# Altium footprint library MB1404.PcbLib: 69 footprints (part 3 of 5)
Each footprint in its own frame and in the unit in brackets; x right, y up, seen from the top. Pads: shape width x height; smd on the part's side, far side on the other; paste and mask are expansions set on the pad; w line width, h text height; cw(c..) or ccw(c..) is an arc to the next point about the centre after c.
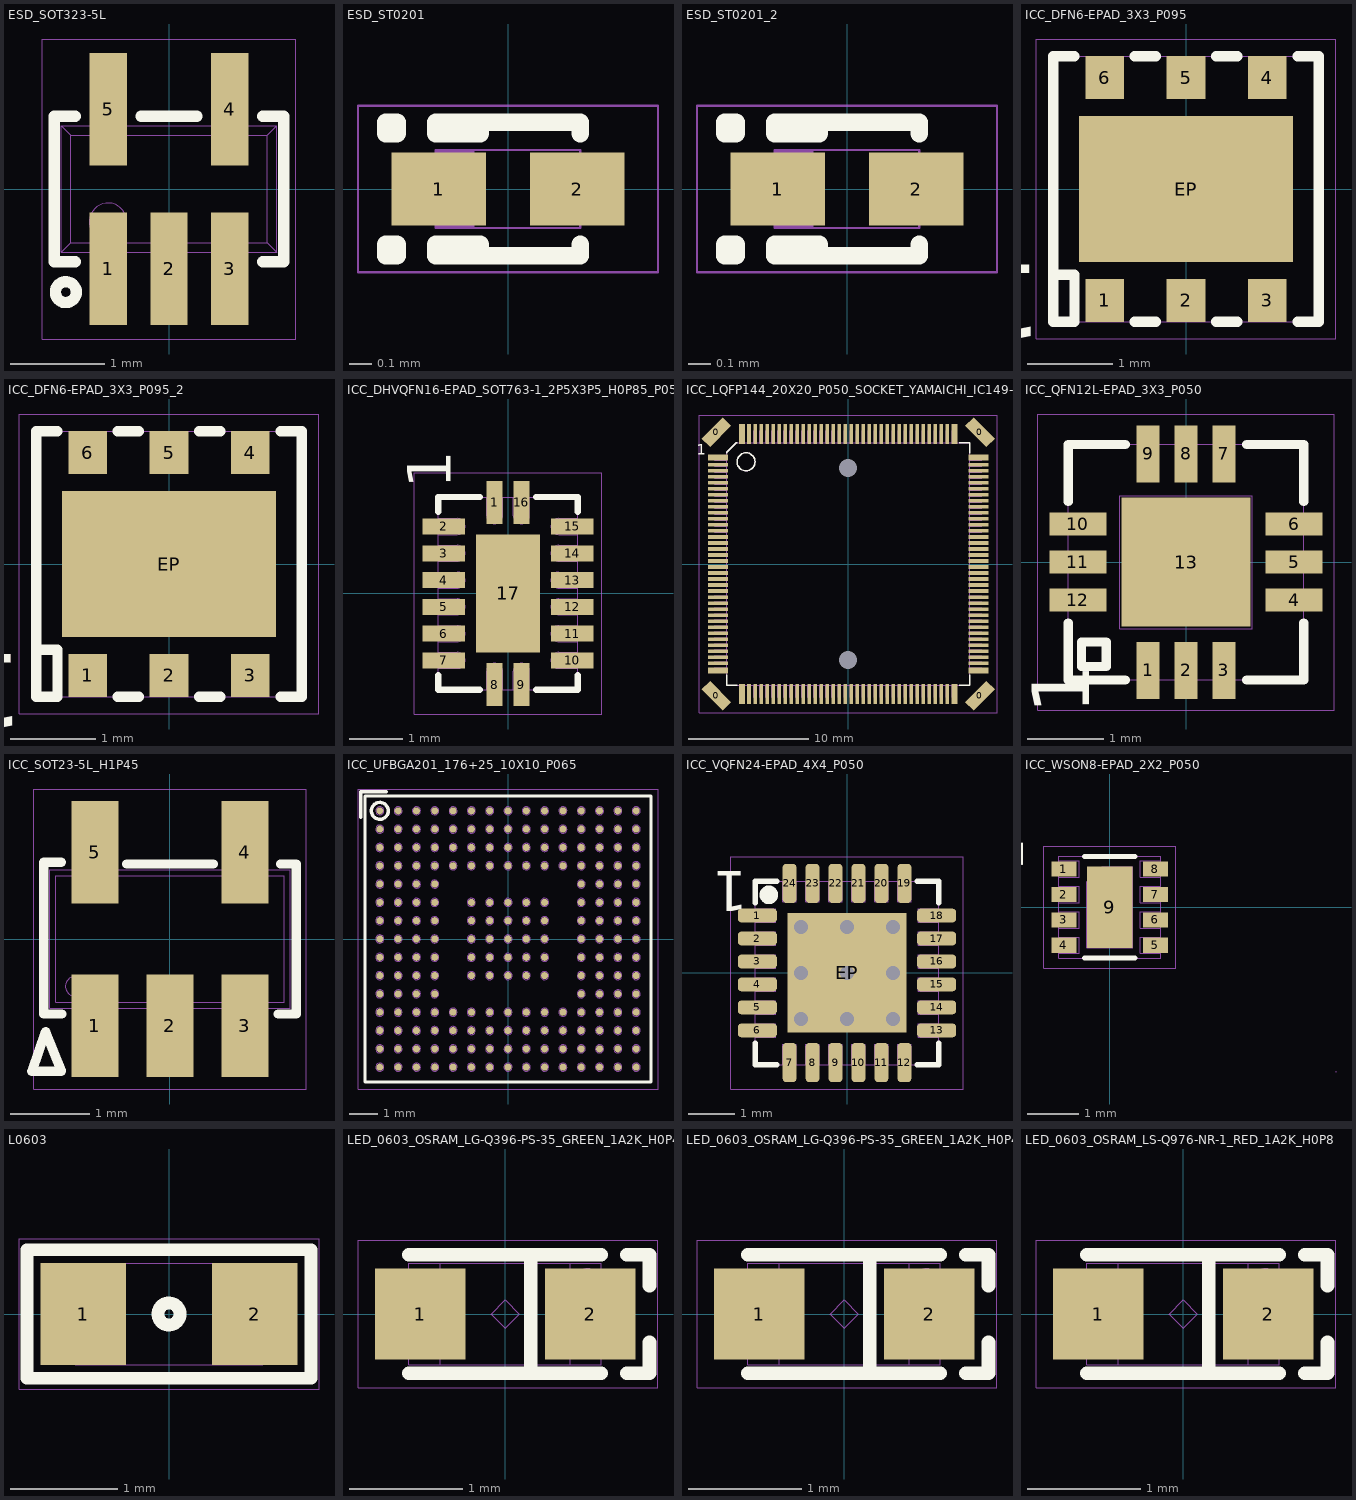
[diagram p2: the footprints below, top view; thin cyan lines are the x and y axes]

## ESD_SOT323-5L [mm]
height 1.1
pads (5):
  rect 0.4x1.2 smd mask+0.05: 1(-0.65,-0.85) 2(0,-0.85) 3(0.65,-0.85) 4(0.65,0.85) 5(-0.65,0.85)
Top Overlay:
  circle w0.12: c-1.1,-1.1 r0.112
  lines w0.12: -1,-0.775 -1.225,-0.775 -1.225,0.775 -1,0.775 ; -0.3,0.775 0.3,0.775 ; 1,-0.775 1.225,-0.775 1.225,0.775 1,0.775
Mechanical 14:
  circle w0.01: c-0.65,-0.35 r0.2
  lines w0.01: -0.75,-0.675 -0.75,-1.125 -0.55,-1.125 -0.55,-0.675 ; -0.75,0.675 -0.75,1.125 -0.55,1.125 -0.55,0.675 ; -0.1,-0.675 -0.1,-1.125 0.1,-1.125 0.1,-0.675 ; 0.55,-0.675 0.55,-1.125 0.75,-1.125 0.75,-0.675 ; 0.55,0.675 0.55,1.125 0.75,1.125 0.75,0.675 ; -1.15,-0.675 -1.05,-0.575 ; -1.15,-0.675 -1.15,0.675 ; -1.15,-0.675 1.15,-0.675 ; -1.15,0.675 -1.05,0.575 ; -1.15,0.675 1.15,0.675 ; -1.05,-0.575 -1.05,0.575 ; -1.05,-0.575 1.05,-0.575 ; -1.05,0.575 1.05,0.575 ; 1.05,-0.575 1.15,-0.675 ; 1.05,-0.575 1.05,0.575 ; 1.05,0.575 1.15,0.675 ; 1.15,-0.675 1.15,0.675
  text "'.Designator'" at -1.9,-0.55 h0.75
Mechanical 16:
  lines w0.01: -1.35,-1.6 1.35,-1.6 1.35,1.6 -1.35,1.6 -1.35,-1.6
3D body: height 1.1, standoff 0, extent -1.15,-0.675 1.15,0.675
3D body "SOT323-5L.STEP": height 1, standoff 0, extent -1.05,-1.051 1.05,1.051

## ESD_ST0201 [mm]
height 0.33
pads (2):
  rect 0.425x0.33 smd mask+0.05: 1(-0.312,0) 2(0.312,0)
Top Overlay:
  lines w0.08: -0.325,-0.275 -0.125,-0.275 ; -0.325,0.275 -0.125,0.275 ; -0.125,-0.3 -0.125,-0.25 -0.325,-0.25 -0.325,-0.3 0.325,-0.3 0.325,-0.25 ; -0.125,0.3 -0.125,0.25 -0.325,0.25 -0.325,0.3 0.325,0.3 0.325,0.25 ; -0.55,-0.3 -0.55,-0.25 -0.5,-0.25 -0.5,-0.3 -0.55,-0.3 ; -0.55,0.25 -0.5,0.25 -0.5,0.3 -0.55,0.3 -0.55,0.25
Mechanical 14:
  rectangle: -0.325,-0.175 -0.15,0.175
  lines w0.01: -0.325,-0.175 -0.325,0.175 0.325,0.175 0.325,-0.175 -0.325,-0.175
  text "'.Designator'" at -1.1,-0.5 h0.75
  text "K" at -0.575,-0.15 h0.45
Mechanical 16:
  lines w0.01: -0.675,-0.375 -0.675,0.375 0.675,0.375 0.675,-0.375 -0.675,-0.375
3D body: height 0.33, standoff 0, extent -0.325,-0.175 0.325,0.175
3D body "0201.STEP": height 0.34, standoff 0, extent -0.341,-0.165 0.339,0.165

## ESD_ST0201_2 [mm]
pads (2):
  rect 0.425x0.33 smd mask+0.05: 1(-0.312,0) 2(0.312,0)
Top Overlay:
  lines w0.08: -0.325,-0.275 -0.125,-0.275 ; -0.325,0.275 -0.125,0.275 ; -0.125,-0.3 -0.125,-0.25 -0.325,-0.25 -0.325,-0.3 0.325,-0.3 0.325,-0.25 ; -0.125,0.3 -0.125,0.25 -0.325,0.25 -0.325,0.3 0.325,0.3 0.325,0.25 ; -0.55,-0.3 -0.55,-0.25 -0.5,-0.25 -0.5,-0.3 -0.55,-0.3 ; -0.55,0.25 -0.5,0.25 -0.5,0.3 -0.55,0.3 -0.55,0.25
Mechanical 14:
  rectangle: -0.325,-0.175 -0.15,0.175
  lines w0.01: -0.325,-0.175 -0.325,0.175 0.325,0.175 0.325,-0.175 -0.325,-0.175
  text "K" at -0.575,-0.15 h0.45
  text "'.Designator'" at 4.554,0.259 h0.75
Mechanical 16:
  lines w0.01: -0.675,-0.375 -0.675,0.375 0.675,0.375 0.675,-0.375 -0.675,-0.375
3D body: height 0.33, standoff 0, extent -0.325,-0.175 0.325,0.175
3D body "0201.STEP": height 0.34, standoff 0, extent -0.341,-0.165 0.339,0.165

## ICC_DFN6-EPAD_3X3_P095 [mm]
height 1
pads (7):
  rect 0.45x0.5 smd mask+0.05: 1(-0.95,-1.3) 2(0,-1.3) 3(0.95,-1.3) 4(0.95,1.3) 5(0,1.3) 6(-0.95,1.3)
  rect 2.5x1.7 smd mask+0.05: EP(0,0)
Top Overlay:
  lines w0.12: -1.55,-1 -1.3,-1 -1.3,-1.55 -1.55,-1.55 -1.55,1.55 -1.3,1.55 ; -0.6,-1.55 -0.35,-1.55 ; -0.6,1.55 -0.35,1.55 ; 0.35,-1.55 0.6,-1.55 ; 0.35,1.55 0.6,1.55 ; 1.3,-1.55 1.55,-1.55 1.55,1.55 1.3,1.55
  text "1" at -1.677,-0.599 h1.5
Mechanical 14:
  lines w0.01: -1.55,-1.55 -1.55,1.55 1.55,1.55 1.55,-1.55 -1.55,-1.55 ; -1.15,-1.45 -0.75,-1.45 -0.75,-1.05 -1.15,-1.05 -1.15,-1.45
  text "'.Designator'" at 4.598,0.851 h0.75
Mechanical 16:
  lines w0.01: -1.75,-1.75 -1.75,1.75 1.75,1.75 1.75,-1.75 -1.75,-1.75
3D body: height 1, standoff 0, extent -1.55,-1.55 1.55,1.55
3D body "DFN6-EPAD_3X3_P095.STEP": height 0.8, standoff 0, extent -1.5,-1.55 1.5,1.55

## ICC_DFN6-EPAD_3X3_P095_2 [mm]
pads (7):
  rect 0.45x0.5 smd mask+0.05: 1(-0.95,-1.3) 2(0,-1.3) 3(0.95,-1.3) 4(0.95,1.3) 5(0,1.3) 6(-0.95,1.3)
  rect 2.5x1.7 smd mask+0.05: EP(0,0)
Top Overlay:
  lines w0.12: -1.55,-1 -1.3,-1 -1.3,-1.55 -1.55,-1.55 -1.55,1.55 -1.3,1.55 ; -0.6,-1.55 -0.35,-1.55 ; -0.6,1.55 -0.35,1.55 ; 0.35,-1.55 0.6,-1.55 ; 0.35,1.55 0.6,1.55 ; 1.3,-1.55 1.55,-1.55 1.55,1.55 1.3,1.55
  text "1" at -1.696,-0.766 h1.5
Mechanical 14:
  lines w0.01: -1.55,-1.55 -1.55,1.55 1.55,1.55 1.55,-1.55 -1.55,-1.55 ; -1.15,-1.45 -0.75,-1.45 -0.75,-1.05 -1.15,-1.05 -1.15,-1.45
  text "'.Designator'" at 0.829,-4.591 h0.75
Mechanical 16:
  lines w0.01: -1.75,-1.75 -1.75,1.75 1.75,1.75 1.75,-1.75 -1.75,-1.75
3D body: height 1, standoff 0, extent -1.55,-1.55 1.55,1.55
3D body "DFN6-EPAD_3X3_P095.STEP": height 0.8, standoff 0, extent -1.5,-1.55 1.5,1.55

## ICC_DHVQFN16-EPAD_SOT763-1_2P5X3P5_H0P85_P050 [mm] "MCD-01945"
height 1
pads (17):
  rect 0.3x0.8 smd mask+0.05: 1(-0.25,1.7) 8(-0.25,-1.7) 9(0.25,-1.7) 16(0.25,1.7)
  rect 0.8x0.3 smd mask+0.05: 2(-1.2,1.25) 3(-1.2,0.75) 4(-1.2,0.25) 5(-1.2,-0.25) 6(-1.2,-0.75) 7(-1.2,-1.25) 10(1.2,-1.25) 11(1.2,-0.75) 12(1.2,-0.25) 13(1.2,0.25) 14(1.2,0.75) 15(1.2,1.25)
  rect 1.2x2.2 smd mask+0.05: 17(0,0)
Top Overlay:
  lines w0.12: -1.3,-1.525 -1.3,-1.8 -0.525,-1.8 ; -1.3,1.525 -1.3,1.8 -0.525,1.8 ; 0.525,-1.8 1.3,-1.8 1.3,-1.525 ; 0.525,1.8 1.3,1.8 1.3,1.525
  text "1" at -0.8,1.95 h1.4
Mechanical 14:
  lines w0.01: -1.3,-1.4 -0.95,-1.4 ccw(c-0.95,-1.25) -0.8,-1.25 ccw(c-0.95,-1.25) -0.95,-1.1 -1.3,-1.1 ; -1.3,-0.9 -0.95,-0.9 ccw(c-0.95,-0.75) -0.8,-0.75 ccw(c-0.95,-0.75) -0.95,-0.6 -1.3,-0.6 ; -1.3,-0.4 -0.95,-0.4 ccw(c-0.95,-0.25) -0.8,-0.25 ccw(c-0.95,-0.25) -0.95,-0.1 -1.3,-0.1 ; -1.3,0.1 -0.95,0.1 ccw(c-0.95,0.25) -0.8,0.25 ccw(c-0.95,0.25) -0.95,0.4 -1.3,0.4 ; -1.3,0.6 -0.95,0.6 ccw(c-0.95,0.75) -0.8,0.75 ccw(c-0.95,0.75) -0.95,0.9 -1.3,0.9 ; -1.3,1.1 -0.95,1.1 ccw(c-0.95,1.25) -0.8,1.25 ccw(c-0.95,1.25) -0.95,1.4 -1.3,1.4 ; -0.4,-1.8 -0.4,-1.45 cw(c-0.25,-1.45) -0.25,-1.3 cw(c-0.25,-1.45) -0.1,-1.45 -0.1,-1.8 ; -0.4,1.8 -0.4,1.45 ccw(c-0.25,1.45) -0.25,1.3 ccw(c-0.25,1.45) -0.1,1.45 -0.1,1.8 ; 0.1,-1.8 0.1,-1.45 cw(c0.25,-1.45) 0.25,-1.3 cw(c0.25,-1.45) 0.4,-1.45 0.4,-1.8 ; 0.1,1.8 0.1,1.45 ccw(c0.25,1.45) 0.25,1.3 ccw(c0.25,1.45) 0.4,1.45 0.4,1.8 ; 1.3,-1.4 0.95,-1.4 cw(c0.95,-1.25) 0.8,-1.25 cw(c0.95,-1.25) 0.95,-1.1 1.3,-1.1 ; 1.3,-0.9 0.95,-0.9 cw(c0.95,-0.75) 0.8,-0.75 cw(c0.95,-0.75) 0.95,-0.6 1.3,-0.6 ; 1.3,-0.4 0.95,-0.4 cw(c0.95,-0.25) 0.8,-0.25 cw(c0.95,-0.25) 0.95,-0.1 1.3,-0.1 ; 1.3,0.1 0.95,0.1 cw(c0.95,0.25) 0.8,0.25 cw(c0.95,0.25) 0.95,0.4 1.3,0.4 ; 1.3,0.6 0.95,0.6 cw(c0.95,0.75) 0.8,0.75 cw(c0.95,0.75) 0.95,0.9 1.3,0.9 ; 1.3,1.1 0.95,1.1 cw(c0.95,1.25) 0.8,1.25 cw(c0.95,1.25) 0.95,1.4 1.3,1.4 ; -1.3,-1.8 1.3,-1.8 1.3,1.8 -1.3,1.8 -1.3,-1.8 ; -0.575,-1.075 0.575,-1.075 0.575,1.075 -0.575,1.075 -0.575,-1.075
  text "17" at -0.175,-0.125 h0.4
  text "16" at 0.425,1.7 h0.4
  text "2" at -1.175,1.325 h0.4
  text "7" at -1.2,-1.175 h0.4
  text "8" at -0.325,-1.675 h0.4
  text "9" at 0.175,-1.675 h0.4
  text "10" at 1.225,-1.425 h0.4
  text "15" at 1.225,1.075 h0.4
  text "1" at -0.2,1.7 h0.4
  text "'.Designator'" at 0.6,-2.05 h0.75
Mechanical 16:
  lines w0.01: -1.75,-2.25 1.75,-2.25 1.75,2.25 -1.75,2.25 -1.75,-2.25
3D body "User Library-User Library-DHVQFN 16-1.STEP": height 1, standoff -0.05, extent -1.31,-1.81 1.31,1.81
3D body: height 1, standoff 0, extent -1.3,-1.81 1.3,1.81
3D body: height 1.01, standoff 1, extent -0.624,1.326 -0.226,1.725

## ICC_LQFP144_20X20_P050_SOCKET_YAMAICHI_IC149-144-145-B5_NM [mm]
height 1.6
pads (150):
  rect 1x2.5 smd rot 45 mask+0.05: 0(-10.96,-10.96) 0(10.96,10.96)
  rect 1x2.5 smd rot 135 mask+0.05: 0(-10.96,10.96) 0(10.96,-10.96)
  round 0 hole 1.5 unplated mask+0.05: 0(0,-8) 0(0,8)
  rect 1.65x0.5 smd mask+0.05: 1(-10.825,8.85) 36(-10.825,-8.85) 73(10.825,-8.85) 108(10.825,8.85)
  rect 1.65x0.3 smd mask+0.05: 2(-10.825,8.25) 3(-10.825,7.75) 4(-10.825,7.25) 5(-10.825,6.75) 6(-10.825,6.25) 7(-10.825,5.75) 8(-10.825,5.25) 9(-10.825,4.75) 10(-10.825,4.25) 11(-10.825,3.75) 12(-10.825,3.25) 13(-10.825,2.75) 14(-10.825,2.25) 15(-10.825,1.75) 16(-10.825,1.25) 17(-10.825,0.75) 18(-10.825,0.25) 19(-10.825,-0.25) 20(-10.825,-0.75) 21(-10.825,-1.25) 22(-10.825,-1.75) 23(-10.825,-2.25) 24(-10.825,-2.75) 25(-10.825,-3.25) 26(-10.825,-3.75) 27(-10.825,-4.25) 28(-10.825,-4.75) 29(-10.825,-5.25) 30(-10.825,-5.75) 31(-10.825,-6.25) 32(-10.825,-6.75) 33(-10.825,-7.25) 34(-10.825,-7.75) 35(-10.825,-8.25) 74(10.825,-8.25) 75(10.825,-7.75) 76(10.825,-7.25) 77(10.825,-6.75) 78(10.825,-6.25) 79(10.825,-5.75) 80(10.825,-5.25) 81(10.825,-4.75) 82(10.825,-4.25) 83(10.825,-3.75) 84(10.825,-3.25) 85(10.825,-2.75) 86(10.825,-2.25) 87(10.825,-1.75) 88(10.825,-1.25) 89(10.825,-0.75) 90(10.825,-0.25) 91(10.825,0.25) 92(10.825,0.75) 93(10.825,1.25) 94(10.825,1.75) 95(10.825,2.25) 96(10.825,2.75) 97(10.825,3.25) 98(10.825,3.75) 99(10.825,4.25) 100(10.825,4.75) 101(10.825,5.25) 102(10.825,5.75) 103(10.825,6.25) 104(10.825,6.75) 105(10.825,7.25) 106(10.825,7.75) 107(10.825,8.25)
  rect 0.5x1.65 smd mask+0.05: 37(-8.85,-10.825) 72(8.85,-10.825) 109(8.85,10.825) 144(-8.85,10.825)
  rect 0.3x1.65 smd mask+0.05: 38(-8.25,-10.825) 39(-7.75,-10.825) 40(-7.25,-10.825) 41(-6.75,-10.825) 42(-6.25,-10.825) 43(-5.75,-10.825) 44(-5.25,-10.825) 45(-4.75,-10.825) 46(-4.25,-10.825) 47(-3.75,-10.825) 48(-3.25,-10.825) 49(-2.75,-10.825) 50(-2.25,-10.825) 51(-1.75,-10.825) 52(-1.25,-10.825) 53(-0.75,-10.825) 54(-0.25,-10.825) 55(0.25,-10.825) 56(0.75,-10.825) 57(1.25,-10.825) 58(1.75,-10.825) 59(2.25,-10.825) 60(2.75,-10.825) 61(3.25,-10.825) 62(3.75,-10.825) 63(4.25,-10.825) 64(4.75,-10.825) 65(5.25,-10.825) 66(5.75,-10.825) 67(6.25,-10.825) 68(6.75,-10.825) 69(7.25,-10.825) 70(7.75,-10.825) 71(8.25,-10.825) 110(8.25,10.825) 111(7.75,10.825) 112(7.25,10.825) 113(6.75,10.825) 114(6.25,10.825) 115(5.75,10.825) 116(5.25,10.825) 117(4.75,10.825) 118(4.25,10.825) 119(3.75,10.825) 120(3.25,10.825) 121(2.75,10.825) 122(2.25,10.825) 123(1.75,10.825) 124(1.25,10.825) 125(0.75,10.825) 126(0.25,10.825) 127(-0.25,10.825) 128(-0.75,10.825) 129(-1.25,10.825) 130(-1.75,10.825) 131(-2.25,10.825) 132(-2.75,10.825) 133(-3.25,10.825) 134(-3.75,10.825) 135(-4.25,10.825) 136(-4.75,10.825) 137(-5.25,10.825) 138(-5.75,10.825) 139(-6.25,10.825) 140(-6.75,10.825) 141(-7.25,10.825) 142(-7.75,10.825) 143(-8.25,10.825)
Top Overlay:
  circle w0.12: c-8.5,8.5 r0.75
  lines w0.12: -10.1,-9.225 -10.1,-10.1 -9.225,-10.1 ; -10.1,9.225 -10.1,9.3 -9.3,10.1 -9.225,10.1 ; 9.225,-10.1 10.1,-10.1 10.1,-9.225 ; 9.225,10.1 10.1,10.1 10.1,9.225
  text "1" at -12.579,8.791 h1.5
Mechanical 14:
  drawing of 438 lines, arcs and shapes, not listed
  text "1" at -9.85,8.425 h1
  text "36" at -10,-9.25 h1
  text "108" at 7.975,8.25 h1
  text "144" at -9.475,9.05 h1
  text "'.Designator'" at -0.554,5.166 h0.75
  text "73" at 8.05,-9.25 h1
  text "72" at 7.85,-10.025 h1
  text "37" at -9.725,-10 h1
  text "109" at 7.425,9.05 h1
Mechanical 16:
  lines w0.01: -12.375,-12.375 -10.65,-12.375 12.375,-12.375 12.375,12.375 -8.125,12.375 -12.375,12.375 -12.375,-12.375
3D body "LQFP144_20X20_P050.STEP": height 1.6, standoff 0, extent -11,-11 11,11

## ICC_QFN12L-EPAD_3X3_P050 [mm] "MCD-01809"
height 0.8
pads (13):
  rect 0.3x0.75 smd mask+0.05: 1(-0.5,-1.425) 2(0,-1.425) 3(0.5,-1.425) 7(0.5,1.425) 8(0,1.425) 9(-0.5,1.425)
  rect 0.75x0.3 smd mask+0.05: 4(1.425,-0.5) 5(1.425,0) 6(1.425,0.5) 10(-1.425,0.5) 11(-1.425,0) 12(-1.425,-0.5)
  rect 1.7x1.7 smd mask+0.05: 13(0,0)
Top Overlay:
  lines w0.12: -1.55,-0.8 -1.55,-1.55 -0.8,-1.55 ; -1.55,0.8 -1.55,1.55 -0.8,1.55 ; 0.8,-1.55 1.55,-1.55 1.55,-0.8 ; 0.8,1.55 1.55,1.55 1.55,0.8 ; -1.375,-1.375 -1.05,-1.375 -1.05,-1.05 -1.375,-1.05 -1.375,-1.375
  text "1" at -1.025,-2 h1.3
Mechanical 14:
  lines w0.01: -1.55,-0.6 -1.15,-0.6 -1.15,-0.4 -1.55,-0.4 ; -1.55,-0.1 -1.15,-0.1 -1.15,0.1 -1.55,0.1 ; -1.55,0.4 -1.15,0.4 -1.15,0.6 -1.55,0.6 ; -0.6,-1.55 -0.6,-1.15 -0.4,-1.15 -0.4,-1.55 ; -0.6,1.55 -0.6,1.15 -0.4,1.15 -0.4,1.55 ; -0.1,-1.55 -0.1,-1.15 0.1,-1.15 0.1,-1.55 ; -0.1,1.55 -0.1,1.15 0.1,1.15 0.1,1.55 ; 0.4,-1.55 0.4,-1.15 0.6,-1.15 0.6,-1.55 ; 0.4,1.55 0.4,1.15 0.6,1.15 0.6,1.55 ; 1.55,-0.6 1.15,-0.6 1.15,-0.4 1.55,-0.4 ; 1.55,-0.1 1.15,-0.1 1.15,0.1 1.55,0.1 ; 1.55,0.4 1.15,0.4 1.15,0.6 1.55,0.6 ; -1.55,-1.55 -1.55,1.55 1.55,1.55 1.55,-1.55 -1.55,-1.55 ; -1.375,-1.375 -1.05,-1.375 -1.05,-1.05 -1.375,-1.05 -1.375,-1.375 ; -0.875,-0.875 0.875,-0.875 0.875,0.875 -0.875,0.875 -0.875,-0.875
  text "13" at -0.15,-0.125 h0.4
  text "9" at -0.575,1.225 h0.4
  text "7" at 0.425,1.2 h0.4
  text "6" at 1.275,0.375 h0.4
  text "4" at 1.25,-0.65 h0.4
  text "3" at 0.425,-1.475 h0.4
  text "1" at -0.575,-1.475 h0.4
  text "10" at -1.525,0.4 h0.4
  text "12" at -1.5,-0.625 h0.4
  text "'.Designator'" at 0.275,-4.5 h0.75
Mechanical 16:
  lines w0.01: -1.95,-1.95 -1.95,1.95 1.95,1.95 1.95,-1.95 -1.95,-1.95
3D body "User Library-QFN12_3x3x0_8.STEP": height 0.78, standoff -0.02, extent -1.51,-1.51 1.51,1.51
3D body: height 0.8, standoff 0, extent -1.55,-1.55 1.55,1.55

## ICC_SOT23-5L_H1P45 [mm]
height 1.45
pads (5):
  rect 0.6x1.3 smd mask+0.05: 1(-0.95,-1.1) 2(0,-1.1) 3(0.95,-1.1) 4(0.95,1.1) 5(-0.95,1.1)
Top Overlay:
  lines w0.12: -1.375,0.975 -1.6,0.975 -1.6,-0.95 -1.372,-0.95 ; -0.55,0.95 0.55,0.95 ; 1.372,-0.95 1.6,-0.95 1.6,0.95 1.4,0.95 ; -1.75,-1.675 -1.575,-1.175 -1.375,-1.675 -1.75,-1.675
Mechanical 14:
  circle w0.01: c-1.2,-0.6 r0.125
  lines w0.01: -1.15,-0.875 -1.15,-1.5 -0.75,-1.5 -0.75,-0.875 ; -1.15,0.875 -1.15,1.5 -0.75,1.5 -0.75,0.875 ; -0.2,-0.875 -0.2,-1.5 0.2,-1.5 0.2,-0.875 ; 0.75,-0.875 0.75,-1.5 1.15,-1.5 1.15,-0.875 ; 0.75,0.875 0.75,1.5 1.15,1.5 1.15,0.875 ; -1.525,-0.875 -1.525,0.875 1.525,0.875 1.525,-0.875 -1.525,-0.875 ; -1.45,-0.8 1.45,-0.8 1.45,0.8 -1.45,0.8 -1.45,-0.8
  text "'.Designator'" at 1.95,0.45 h0.75
Mechanical 16:
  lines w0.01: -1.725,-1.9 -1.725,1.9 1.725,1.9 1.725,-1.9 -1.725,-1.9
3D body "SOT23-5L.STEP": height 1.1, standoff 0, extent -1.5,-1.25 1.5,1.25
3D body: height 1.45, standoff 0, extent -1.524,-0.874 1.524,0.874

## ICC_UFBGA201_176+25_10X10_P065 [mm] "IPC"
height 0.6
pads (201):
  round 0.25 smd mask+0.05: A1(-4.55,4.55) A2(-3.9,4.55) A3(-3.25,4.55) A4(-2.6,4.55) A5(-1.95,4.55) A6(-1.3,4.55) A7(-0.65,4.55) A8(0,4.55) A9(0.65,4.55) A10(1.3,4.55) A11(1.95,4.55) A12(2.6,4.55) A13(3.25,4.55) A14(3.9,4.55) A15(4.55,4.55) B1(-4.55,3.9) B2(-3.9,3.9) B3(-3.25,3.9) B4(-2.6,3.9) B5(-1.95,3.9) B6(-1.3,3.9) B7(-0.65,3.9) B8(0,3.9) B9(0.65,3.9) B10(1.3,3.9) B11(1.95,3.9) B12(2.6,3.9) B13(3.25,3.9) B14(3.9,3.9) B15(4.55,3.9) C1(-4.55,3.25) C2(-3.9,3.25) C3(-3.25,3.25) C4(-2.6,3.25) C5(-1.95,3.25) C6(-1.3,3.25) C7(-0.65,3.25) C8(0,3.25) C9(0.65,3.25) C10(1.3,3.25) C11(1.95,3.25) C12(2.6,3.25) C13(3.25,3.25) C14(3.9,3.25) C15(4.55,3.25) D1(-4.55,2.6) D2(-3.9,2.6) D3(-3.25,2.6) D4(-2.6,2.6) D5(-1.95,2.6) D6(-1.3,2.6) D7(-0.65,2.6) D8(0,2.6) D9(0.65,2.6) D10(1.3,2.6) D11(1.95,2.6) D12(2.6,2.6) D13(3.25,2.6) D14(3.9,2.6) D15(4.55,2.6) E1(-4.55,1.95) E2(-3.9,1.95) E3(-3.25,1.95) E4(-2.6,1.95) E12(2.6,1.95) E13(3.25,1.95) E14(3.9,1.95) E15(4.55,1.95) F1(-4.55,1.3) F2(-3.9,1.3) F3(-3.25,1.3) F4(-2.6,1.3) F6(-1.3,1.3) F7(-0.65,1.3) F8(0,1.3) F9(0.65,1.3) F10(1.3,1.3) F12(2.6,1.3) F13(3.25,1.3) F14(3.9,1.3) F15(4.55,1.3) G1(-4.55,0.65) G2(-3.9,0.65) G3(-3.25,0.65) G4(-2.6,0.65) G6(-1.3,0.65) G7(-0.65,0.65) G8(0,0.65) G9(0.65,0.65) G10(1.3,0.65) G12(2.6,0.65) G13(3.25,0.65) G14(3.9,0.65) G15(4.55,0.65) H1(-4.55,0) H2(-3.9,0) H3(-3.25,0) H4(-2.6,0) H6(-1.3,0) H7(-0.65,0) H8(0,0) H9(0.65,0) H10(1.3,0) H12(2.6,0) H13(3.25,0) H14(3.9,0) H15(4.55,0) J1(-4.55,-0.65) J2(-3.9,-0.65) J3(-3.25,-0.65) J4(-2.6,-0.65) J6(-1.3,-0.65) J7(-0.65,-0.65) J8(0,-0.65) J9(0.65,-0.65) J10(1.3,-0.65) J12(2.6,-0.65) J13(3.25,-0.65) J14(3.9,-0.65) J15(4.55,-0.65) K1(-4.55,-1.3) K2(-3.9,-1.3) K3(-3.25,-1.3) K4(-2.6,-1.3) K6(-1.3,-1.3) K7(-0.65,-1.3) K8(0,-1.3) K9(0.65,-1.3) K10(1.3,-1.3) K12(2.6,-1.3) K13(3.25,-1.3) K14(3.9,-1.3) K15(4.55,-1.3) L1(-4.55,-1.95) L2(-3.9,-1.95) L3(-3.25,-1.95) L4(-2.6,-1.95) L12(2.6,-1.95) L13(3.25,-1.95) L14(3.9,-1.95) L15(4.55,-1.95) M1(-4.55,-2.6) M2(-3.9,-2.6) M3(-3.25,-2.6) M4(-2.6,-2.6) M5(-1.95,-2.6) M6(-1.3,-2.6) M7(-0.65,-2.6) M8(0,-2.6) M9(0.65,-2.6) M10(1.3,-2.6) M11(1.95,-2.6) M12(2.6,-2.6) M13(3.25,-2.6) M14(3.9,-2.6) M15(4.55,-2.6) N1(-4.55,-3.25) N2(-3.9,-3.25) N3(-3.25,-3.25) N4(-2.6,-3.25) N5(-1.95,-3.25) N6(-1.3,-3.25) N7(-0.65,-3.25) N8(0,-3.25) N9(0.65,-3.25) N10(1.3,-3.25) N11(1.95,-3.25) N12(2.6,-3.25) N13(3.25,-3.25) N14(3.9,-3.25) N15(4.55,-3.25) P1(-4.55,-3.9) P2(-3.9,-3.9) P3(-3.25,-3.9) P4(-2.6,-3.9) P5(-1.95,-3.9) P6(-1.3,-3.9) P7(-0.65,-3.9) P8(0,-3.9) P9(0.65,-3.9) P10(1.3,-3.9) P11(1.95,-3.9) P12(2.6,-3.9) P13(3.25,-3.9) P14(3.9,-3.9) P15(4.55,-3.9) R1(-4.55,-4.55) R2(-3.9,-4.55) R3(-3.25,-4.55) R4(-2.6,-4.55) R5(-1.95,-4.55) R6(-1.3,-4.55) R7(-0.65,-4.55) R8(0,-4.55) R9(0.65,-4.55) R10(1.3,-4.55) R11(1.95,-4.55) R12(2.6,-4.55) R13(3.25,-4.55) R14(3.9,-4.55) R15(4.55,-4.55)
Top Overlay:
  circle w0.12: c-4.55,4.55 r0.3
  lines w0.12: -5.225,4.325 -5.225,5.225 -4.325,5.225 ; -5.075,-5.075 -5.075,5.075 5.075,5.075 5.075,-5.075 -5.075,-5.075
Mechanical 14:
  drawing of 205 lines, arcs and shapes, not listed
  text "A1" at -4.9,4.4 h0.75
  text "'.Designator'" at -0.604,4.166 h0.75
Mechanical 16:
  lines w0.01: -5.325,-5.325 -5.325,5.325 5.325,5.325 5.325,-5.325 -5.325,-5.325
3D body: height 0.25, standoff -0.05, extent -4.036,-2.093 -3.755,-1.807
3D body: height 0.25, standoff -0.05, extent -4.686,-2.093 -4.405,-1.807
3D body: height 0.25, standoff -0.05, extent -3.386,-2.093 -3.105,-1.807
3D body: height 0.25, standoff -0.05, extent -2.736,-2.093 -2.455,-1.807
3D body: height 0.25, standoff -0.05, extent 2.464,-2.093 2.745,-1.807
3D body: height 0.25, standoff -0.05, extent 3.114,-2.093 3.395,-1.807
3D body: height 0.25, standoff -0.05, extent 3.764,-2.093 4.045,-1.807
3D body: height 0.25, standoff -0.05, extent 4.414,-2.093 4.695,-1.807
3D body: height 0.25, standoff -0.05, extent 4.414,-2.743 4.695,-2.457
3D body: height 0.25, standoff -0.05, extent 3.764,-2.743 4.045,-2.457
3D body: height 0.25, standoff -0.05, extent 3.114,-2.743 3.395,-2.457
3D body: height 0.25, standoff -0.05, extent 2.464,-2.743 2.745,-2.457
3D body: height 0.25, standoff -0.05, extent 1.814,-2.743 2.095,-2.457
3D body: height 0.25, standoff -0.05, extent 1.164,-2.743 1.445,-2.457
3D body: height 0.25, standoff -0.05, extent 0.514,-2.743 0.795,-2.457
3D body: height 0.25, standoff -0.05, extent -0.136,-2.743 0.145,-2.457
3D body: height 0.25, standoff -0.05, extent -0.786,-2.743 -0.505,-2.457
3D body: height 0.25, standoff -0.05, extent -1.436,-2.743 -1.155,-2.457
3D body: height 0.25, standoff -0.05, extent -2.086,-2.743 -1.805,-2.457
3D body: height 0.25, standoff -0.05, extent -2.736,-2.743 -2.455,-2.457
3D body: height 0.25, standoff -0.05, extent -3.386,-2.743 -3.105,-2.457
3D body: height 0.25, standoff -0.05, extent -4.686,-2.743 -4.405,-2.457
3D body: height 0.25, standoff -0.05, extent -4.036,-2.743 -3.755,-2.457
3D body: height 0.25, standoff -0.05, extent 4.414,-3.393 4.695,-3.107
3D body: height 0.25, standoff -0.05, extent 3.764,-3.393 4.045,-3.107
3D body: height 0.25, standoff -0.05, extent 3.114,-3.393 3.395,-3.107
3D body: height 0.25, standoff -0.05, extent 2.464,-3.393 2.745,-3.107
3D body: height 0.25, standoff -0.05, extent 1.814,-3.393 2.095,-3.107
3D body: height 0.25, standoff -0.05, extent 1.164,-3.393 1.445,-3.107
3D body: height 0.25, standoff -0.05, extent 0.514,-3.393 0.795,-3.107
3D body: height 0.25, standoff -0.05, extent -0.136,-3.393 0.145,-3.107
3D body: height 0.25, standoff -0.05, extent -0.786,-3.393 -0.505,-3.107
3D body: height 0.25, standoff -0.05, extent -1.436,-3.393 -1.155,-3.107
3D body: height 0.25, standoff -0.05, extent -2.086,-3.393 -1.805,-3.107
3D body: height 0.25, standoff -0.05, extent -2.736,-3.393 -2.455,-3.107
3D body: height 0.25, standoff -0.05, extent -3.386,-3.393 -3.105,-3.107
3D body: height 0.25, standoff -0.05, extent -4.686,-3.393 -4.405,-3.107
3D body: height 0.25, standoff -0.05, extent -4.036,-3.393 -3.755,-3.107
3D body: height 0.25, standoff -0.05, extent 4.414,-4.043 4.695,-3.757
3D body: height 0.25, standoff -0.05, extent 3.764,-4.043 4.045,-3.757
3D body: height 0.25, standoff -0.05, extent 3.114,-4.043 3.395,-3.757
3D body: height 0.25, standoff -0.05, extent 2.464,-4.043 2.745,-3.757
3D body: height 0.25, standoff -0.05, extent 1.814,-4.043 2.095,-3.757
3D body: height 0.25, standoff -0.05, extent 1.164,-4.043 1.445,-3.757
3D body: height 0.25, standoff -0.05, extent 0.514,-4.043 0.795,-3.757
3D body: height 0.25, standoff -0.05, extent -0.136,-4.043 0.145,-3.757
3D body: height 0.25, standoff -0.05, extent -0.786,-4.043 -0.505,-3.757
3D body: height 0.25, standoff -0.05, extent -1.436,-4.043 -1.155,-3.757
3D body: height 0.25, standoff -0.05, extent -2.086,-4.043 -1.805,-3.757
3D body: height 0.25, standoff -0.05, extent -2.736,-4.043 -2.455,-3.757
3D body: height 0.25, standoff -0.05, extent -3.386,-4.043 -3.105,-3.757
3D body: height 0.25, standoff -0.05, extent -4.686,-4.043 -4.405,-3.757
3D body: height 0.25, standoff -0.05, extent -4.036,-4.043 -3.755,-3.757
3D body: height 0.25, standoff -0.05, extent 4.414,-4.693 4.695,-4.407
3D body: height 0.25, standoff -0.05, extent 3.764,-4.693 4.045,-4.407
3D body: height 0.25, standoff -0.05, extent 3.114,-4.693 3.395,-4.407
3D body: height 0.25, standoff -0.05, extent 2.464,-4.693 2.745,-4.407
3D body: height 0.25, standoff -0.05, extent 1.814,-4.693 2.095,-4.407
3D body: height 0.25, standoff -0.05, extent 1.164,-4.693 1.445,-4.407
3D body: height 0.25, standoff -0.05, extent 0.514,-4.693 0.795,-4.407
3D body: height 0.25, standoff -0.05, extent -0.136,-4.693 0.145,-4.407
3D body: height 0.25, standoff -0.05, extent -0.786,-4.693 -0.505,-4.407
3D body: height 0.25, standoff -0.05, extent -1.436,-4.693 -1.155,-4.407
3D body: height 0.25, standoff -0.05, extent -2.086,-4.693 -1.805,-4.407
3D body: height 0.25, standoff -0.05, extent -2.736,-4.693 -2.455,-4.407
3D body: height 0.25, standoff -0.05, extent -3.386,-4.693 -3.105,-4.407
3D body: height 0.25, standoff -0.05, extent -4.686,-4.693 -4.405,-4.407
3D body: height 0.25, standoff -0.05, extent -4.036,-4.693 -3.755,-4.407
3D body: height 0.25, standoff -0.05, extent -4.036,1.157 -3.755,1.443
3D body: height 0.25, standoff -0.05, extent -4.686,1.157 -4.405,1.443
3D body: height 0.25, standoff -0.05, extent -3.386,1.157 -3.105,1.443
3D body: height 0.25, standoff -0.05, extent -2.736,1.157 -2.455,1.443
3D body: height 0.25, standoff -0.05, extent -1.436,1.157 -1.155,1.443
3D body: height 0.25, standoff -0.05, extent -0.786,1.157 -0.505,1.443
3D body: height 0.25, standoff -0.05, extent -0.136,1.157 0.145,1.443
3D body: height 0.25, standoff -0.05, extent 0.514,1.157 0.795,1.443
3D body: height 0.25, standoff -0.05, extent 1.164,1.157 1.445,1.443
3D body: height 0.25, standoff -0.05, extent 2.464,1.157 2.745,1.443
3D body: height 0.25, standoff -0.05, extent 3.114,1.157 3.395,1.443
3D body: height 0.25, standoff -0.05, extent 3.764,1.157 4.045,1.443
3D body: height 0.25, standoff -0.05, extent 4.414,1.157 4.695,1.443
3D body: height 0.25, standoff -0.05, extent 4.414,0.507 4.695,0.793
3D body: height 0.25, standoff -0.05, extent 3.764,0.507 4.045,0.793
3D body: height 0.25, standoff -0.05, extent 3.114,0.507 3.395,0.793
3D body: height 0.25, standoff -0.05, extent 2.464,0.507 2.745,0.793
3D body: height 0.25, standoff -0.05, extent 1.164,0.507 1.445,0.793
3D body: height 0.25, standoff -0.05, extent 0.514,0.507 0.795,0.793
3D body: height 0.25, standoff -0.05, extent -0.136,0.507 0.145,0.793
3D body: height 0.25, standoff -0.05, extent -0.786,0.507 -0.505,0.793
3D body: height 0.25, standoff -0.05, extent -1.436,0.507 -1.155,0.793
3D body: height 0.25, standoff -0.05, extent -2.736,0.507 -2.455,0.793
3D body: height 0.25, standoff -0.05, extent -3.386,0.507 -3.105,0.793
3D body: height 0.25, standoff -0.05, extent -4.686,0.507 -4.405,0.793
3D body: height 0.25, standoff -0.05, extent -4.036,0.507 -3.755,0.793
3D body: height 0.25, standoff -0.05, extent 4.414,-0.143 4.695,0.143
3D body: height 0.25, standoff -0.05, extent 3.764,-0.143 4.045,0.143
3D body: height 0.25, standoff -0.05, extent 3.114,-0.143 3.395,0.143
3D body: height 0.25, standoff -0.05, extent 2.464,-0.143 2.745,0.143
3D body: height 0.25, standoff -0.05, extent 1.164,-0.143 1.445,0.143
3D body: height 0.25, standoff -0.05, extent 0.514,-0.143 0.795,0.143
3D body: height 0.25, standoff -0.05, extent -0.136,-0.143 0.145,0.143
3D body: height 0.25, standoff -0.05, extent -0.786,-0.143 -0.505,0.143
3D body: height 0.25, standoff -0.05, extent -1.436,-0.143 -1.155,0.143
3D body: height 0.25, standoff -0.05, extent -2.736,-0.143 -2.455,0.143
3D body: height 0.25, standoff -0.05, extent -3.386,-0.143 -3.105,0.143
3D body: height 0.25, standoff -0.05, extent -4.686,-0.143 -4.405,0.143
3D body: height 0.25, standoff -0.05, extent -4.036,-0.143 -3.755,0.143
3D body: height 0.25, standoff -0.05, extent 4.414,-0.793 4.695,-0.507
3D body: height 0.25, standoff -0.05, extent 3.764,-0.793 4.045,-0.507
3D body: height 0.25, standoff -0.05, extent 3.114,-0.793 3.395,-0.507
3D body: height 0.25, standoff -0.05, extent 2.464,-0.793 2.745,-0.507
3D body: height 0.25, standoff -0.05, extent 1.164,-0.793 1.445,-0.507
3D body: height 0.25, standoff -0.05, extent 0.514,-0.793 0.795,-0.507
3D body: height 0.25, standoff -0.05, extent -0.136,-0.793 0.145,-0.507
3D body: height 0.25, standoff -0.05, extent -0.786,-0.793 -0.505,-0.507
3D body: height 0.25, standoff -0.05, extent -1.436,-0.793 -1.155,-0.507
3D body: height 0.25, standoff -0.05, extent -2.736,-0.793 -2.455,-0.507
3D body: height 0.25, standoff -0.05, extent -3.386,-0.793 -3.105,-0.507
3D body: height 0.25, standoff -0.05, extent -4.686,-0.793 -4.405,-0.507
3D body: height 0.25, standoff -0.05, extent -4.036,-0.793 -3.755,-0.507
3D body: height 0.25, standoff -0.05, extent 4.414,-1.443 4.695,-1.157
3D body: height 0.25, standoff -0.05, extent 3.764,-1.443 4.045,-1.157
3D body: height 0.25, standoff -0.05, extent 3.114,-1.443 3.395,-1.157
3D body: height 0.25, standoff -0.05, extent 2.464,-1.443 2.745,-1.157
3D body: height 0.25, standoff -0.05, extent 1.164,-1.443 1.445,-1.157
3D body: height 0.25, standoff -0.05, extent 0.514,-1.443 0.795,-1.157
3D body: height 0.25, standoff -0.05, extent -0.136,-1.443 0.145,-1.157
3D body: height 0.25, standoff -0.05, extent -0.786,-1.443 -0.505,-1.157
3D body: height 0.25, standoff -0.05, extent -1.436,-1.443 -1.155,-1.157
3D body: height 0.25, standoff -0.05, extent -2.736,-1.443 -2.455,-1.157
3D body: height 0.25, standoff -0.05, extent -3.386,-1.443 -3.105,-1.157
3D body: height 0.25, standoff -0.05, extent -4.686,-1.443 -4.405,-1.157
3D body: height 0.25, standoff -0.05, extent -4.036,-1.443 -3.755,-1.157
3D body: height 0.25, standoff -0.05, extent -4.036,1.807 -3.755,2.093
3D body: height 0.25, standoff -0.05, extent -4.686,1.807 -4.405,2.093
3D body: height 0.25, standoff -0.05, extent -3.386,1.807 -3.105,2.093
3D body: height 0.25, standoff -0.05, extent -2.736,1.807 -2.455,2.093
3D body: height 0.25, standoff -0.05, extent 2.464,1.807 2.745,2.093
3D body: height 0.25, standoff -0.05, extent 3.114,1.807 3.395,2.093
3D body: height 0.25, standoff -0.05, extent 3.764,1.807 4.045,2.093
3D body: height 0.25, standoff -0.05, extent 4.414,1.807 4.695,2.093
3D body: height 0.25, standoff -0.05, extent -4.036,2.457 -3.755,2.743
3D body: height 0.25, standoff -0.05, extent -4.686,2.457 -4.405,2.743
3D body: height 0.25, standoff -0.05, extent -3.386,2.457 -3.105,2.743
3D body: height 0.25, standoff -0.05, extent -2.736,2.457 -2.455,2.743
3D body: height 0.25, standoff -0.05, extent -2.086,2.457 -1.805,2.743
3D body: height 0.25, standoff -0.05, extent -1.436,2.457 -1.155,2.743
3D body: height 0.25, standoff -0.05, extent -0.786,2.457 -0.505,2.743
3D body: height 0.25, standoff -0.05, extent -0.136,2.457 0.145,2.743
3D body: height 0.25, standoff -0.05, extent 0.514,2.457 0.795,2.743
3D body: height 0.25, standoff -0.05, extent 1.164,2.457 1.445,2.743
3D body: height 0.25, standoff -0.05, extent 1.814,2.457 2.095,2.743
3D body: height 0.25, standoff -0.05, extent 2.464,2.457 2.745,2.743
3D body: height 0.25, standoff -0.05, extent 3.114,2.457 3.395,2.743
3D body: height 0.25, standoff -0.05, extent 3.764,2.457 4.045,2.743
3D body: height 0.25, standoff -0.05, extent 4.414,2.457 4.695,2.743
3D body: height 0.25, standoff -0.05, extent -4.036,3.107 -3.755,3.393
3D body: height 0.25, standoff -0.05, extent -4.686,3.107 -4.405,3.393
3D body: height 0.25, standoff -0.05, extent -3.386,3.107 -3.105,3.393
3D body: height 0.25, standoff -0.05, extent -2.736,3.107 -2.455,3.393
3D body: height 0.25, standoff -0.05, extent -2.086,3.107 -1.805,3.393
3D body: height 0.25, standoff -0.05, extent -1.436,3.107 -1.155,3.393
3D body: height 0.25, standoff -0.05, extent -0.786,3.107 -0.505,3.393
3D body: height 0.25, standoff -0.05, extent -0.136,3.107 0.145,3.393
3D body: height 0.25, standoff -0.05, extent 0.514,3.107 0.795,3.393
3D body: height 0.25, standoff -0.05, extent 1.164,3.107 1.445,3.393
3D body: height 0.25, standoff -0.05, extent 1.814,3.107 2.095,3.393
3D body: height 0.25, standoff -0.05, extent 2.464,3.107 2.745,3.393
3D body: height 0.25, standoff -0.05, extent 3.114,3.107 3.395,3.393
3D body: height 0.25, standoff -0.05, extent 3.764,3.107 4.045,3.393
3D body: height 0.25, standoff -0.05, extent 4.414,3.107 4.695,3.393
3D body: height 0.25, standoff -0.05, extent -4.036,3.757 -3.755,4.043
3D body: height 0.25, standoff -0.05, extent -4.686,3.757 -4.405,4.043
3D body: height 0.25, standoff -0.05, extent -3.386,3.757 -3.105,4.043
3D body: height 0.25, standoff -0.05, extent -2.736,3.757 -2.455,4.043
3D body: height 0.25, standoff -0.05, extent -2.086,3.757 -1.805,4.043
3D body: height 0.25, standoff -0.05, extent -1.436,3.757 -1.155,4.043
3D body: height 0.25, standoff -0.05, extent -0.786,3.757 -0.505,4.043
3D body: height 0.25, standoff -0.05, extent -0.136,3.757 0.145,4.043
3D body: height 0.25, standoff -0.05, extent 0.514,3.757 0.795,4.043
3D body: height 0.25, standoff -0.05, extent 1.164,3.757 1.445,4.043
3D body: height 0.25, standoff -0.05, extent 1.814,3.757 2.095,4.043
3D body: height 0.25, standoff -0.05, extent 2.464,3.757 2.745,4.043
3D body: height 0.25, standoff -0.05, extent 3.114,3.757 3.395,4.043
3D body: height 0.25, standoff -0.05, extent 3.764,3.757 4.045,4.043
3D body: height 0.25, standoff -0.05, extent 4.414,3.757 4.695,4.043
3D body: height 0.25, standoff -0.05, extent 4.414,4.407 4.695,4.693
3D body: height 0.25, standoff -0.05, extent 3.764,4.407 4.045,4.693
3D body: height 0.25, standoff -0.05, extent 3.114,4.407 3.395,4.693
3D body: height 0.25, standoff -0.05, extent 2.464,4.407 2.745,4.693
3D body: height 0.25, standoff -0.05, extent 1.814,4.407 2.095,4.693
3D body: height 0.25, standoff -0.05, extent 1.164,4.407 1.445,4.693
3D body: height 0.25, standoff -0.05, extent 0.514,4.407 0.795,4.693
3D body: height 0.25, standoff -0.05, extent -0.136,4.407 0.145,4.693
3D body: height 0.25, standoff -0.05, extent -0.786,4.407 -0.505,4.693
3D body: height 0.25, standoff -0.05, extent -1.436,4.407 -1.155,4.693
3D body: height 0.25, standoff -0.05, extent -2.086,4.407 -1.805,4.693
3D body: height 0.25, standoff -0.05, extent -2.736,4.407 -2.455,4.693
3D body: height 0.25, standoff -0.05, extent -3.386,4.407 -3.105,4.693
3D body: height 0.25, standoff -0.05, extent -4.686,4.407 -4.405,4.693
3D body: height 0.25, standoff -0.05, extent -4.036,4.407 -3.755,4.693
3D body: height 0.6, standoff 0.15, extent -5.075,-5.075 5.075,5.075
3D body: height 0.61, standoff 0.6, extent -4.798,4.301 -4.3,4.8

## ICC_VQFN24-EPAD_4X4_P050 [mm]
height 1
pads (25):
  rrect50% 0.85x0.3 smd mask+0.05: 1(-1.95,1.25) 2(-1.95,0.75) 3(-1.95,0.25) 4(-1.95,-0.25) 5(-1.95,-0.75) 6(-1.95,-1.25) 13(1.95,-1.25) 14(1.95,-0.75) 15(1.95,-0.25) 16(1.95,0.25) 17(1.95,0.75) 18(1.95,1.25)
  rrect50% 0.3x0.85 smd mask+0.05: 7(-1.25,-1.95) 8(-0.75,-1.95) 9(-0.25,-1.95) 10(0.25,-1.95) 11(0.75,-1.95) 12(1.25,-1.95) 19(1.25,1.95) 20(0.75,1.95) 21(0.25,1.95) 22(-0.25,1.95) 23(-0.75,1.95) 24(-1.25,1.95)
  rect 2.6x2.6 smd paste-10 mask+0.05: EP(0,0)
via -1,-1 diameter 0.6 hole 0.3
via 0,-1 diameter 0.6 hole 0.3
via 1,-1 diameter 0.6 hole 0.3
via 1,0 diameter 0.6 hole 0.3
via 1,1 diameter 0.6 hole 0.3
via 0,1 diameter 0.6 hole 0.3
via -1,1 diameter 0.6 hole 0.3
via -1,0 diameter 0.6 hole 0.3
via 0,0 diameter 0.6 hole 0.3
Top Overlay:
  circle w0.254: c-1.7,1.7 r0.075
  lines w0.12: -2,-1.525 -2,-2 -1.525,-2 ; -2,1.525 -2,2 -1.525,2 ; 1.525,-2 2,-2 2,-1.525 ; 1.525,2 2,2 2,1.525
  text "1" at -2.159,2.504 h1.5
Top Paste:
  rectangle: -0.875,0.125 -0.125,0.875
  rectangle: 0.125,0.125 0.875,0.875
  rectangle: 0.125,-0.875 0.875,-0.125
  rectangle: -0.875,-0.875 -0.125,-0.125
Mechanical 14:
  lines w0.01: -2,-1.4 -1.55,-1.4 -1.55,-1.1 -2,-1.1 ; -2,-0.9 -1.55,-0.9 -1.55,-0.6 -2,-0.6 ; -2,-0.4 -1.55,-0.4 -1.55,-0.1 -2,-0.1 ; -2,0.1 -1.55,0.1 -1.55,0.4 -2,0.4 ; -2,0.6 -1.55,0.6 -1.55,0.9 -2,0.9 ; -2,1.1 -1.55,1.1 -1.55,1.4 -2,1.4 ; -1.4,-2 -1.4,-1.55 -1.1,-1.55 -1.1,-2 ; -1.4,2 -1.4,1.55 -1.1,1.55 -1.1,2 ; -0.9,-2 -0.9,-1.55 -0.6,-1.55 -0.6,-2 ; -0.9,2 -0.9,1.55 -0.6,1.55 -0.6,2 ; -0.4,-2 -0.4,-1.55 -0.1,-1.55 -0.1,-2 ; -0.4,2 -0.4,1.55 -0.1,1.55 -0.1,2 ; 0.1,-2 0.1,-1.55 0.4,-1.55 0.4,-2 ; 0.1,2 0.1,1.55 0.4,1.55 0.4,2 ; 0.6,-2 0.6,-1.55 0.9,-1.55 0.9,-2 ; 0.6,2 0.6,1.55 0.9,1.55 0.9,2 ; 1.1,-2 1.1,-1.55 1.4,-1.55 1.4,-2 ; 1.1,2 1.1,1.55 1.4,1.55 1.4,2 ; 2,-1.4 1.55,-1.4 1.55,-1.1 2,-1.1 ; 2,-0.9 1.55,-0.9 1.55,-0.6 2,-0.6 ; 2,-0.4 1.55,-0.4 1.55,-0.1 2,-0.1 ; 2,0.1 1.55,0.1 1.55,0.4 2,0.4 ; 2,0.6 1.55,0.6 1.55,0.9 2,0.9 ; 2,1.1 1.55,1.1 1.55,1.4 2,1.4 ; -2,-2 2,-2 2,2 -2,2 -2,-2 ; -1.25,-1.25 -1.25,1.25 1.25,1.25 1.25,-1.25 -1.25,-1.25
  text "25" at -0.3,-0.225 h0.65
  text "1" at -2.475,1.325 h0.65
  text "7" at -1.4,-2.45 h0.65
  text "12" at 0.975,-2.45 h0.65
  text "13" at 2.45,-1.525 h0.65
  text "18" at 2.45,0.975 h0.65
  text "19" at 0.975,2.05 h0.65
  text "24" at -1.575,2.05 h0.65
  text "6" at -2.45,-1.125 h0.65
  text "'.Designator'" at 4.566,0.004 h0.75
Mechanical 16:
  lines w0.01: -2.525,-2.525 -2.525,2.525 2.525,2.525 2.525,-2.525 -2.525,-2.525
3D body: height 1, standoff 0, extent -2,-2 2,2
3D body: height 1.1, standoff 1, extent -1.448,1.051 -1.05,1.45
3D body "VQFN24-EPAD.STEP": height 1.05, standoff -0.03, extent -2.05,-2.05 2.05,2.05

## ICC_WSON8-EPAD_2X2_P050 [mm] "MCD-02194"
height 0.8
pads (9):
  rect 0.5x0.3 smd paste+0 mask+0.05: 1(-0.9,0.75) 2(-0.9,0.25) 3(-0.9,-0.25) 4(-0.9,-0.75) 5(0.9,-0.75) 6(0.9,-0.25) 7(0.9,0.25) 8(0.9,0.75)
  rect 0.9x1.6 smd paste+0 mask+0.05: 9(0,0)
Top Overlay:
  lines w0.1: -0.5,-1 0.5,-1 ; -0.5,1 0.5,1
  text "1" at -1.45,0.7 h1.3
Mechanical 14:
  lines w0.01: -1,-0.91 -0.6,-0.91 -0.6,-0.59 -1,-0.59 ; -1,-0.41 -0.6,-0.41 -0.6,-0.09 -1,-0.09 ; -1,0.09 -0.6,0.09 -0.6,0.41 -1,0.41 ; -1,0.59 -0.6,0.59 -0.6,0.91 -1,0.91 ; -1,-1 1,-1 1,1 -1,1 -1,-1 ; -0.45,-0.8 -0.45,0.5 -0.15,0.8 0.45,0.8 0.45,-0.8 -0.45,-0.8 ; 0.6,-0.91 0.6,-0.59 1,-0.59 1,-0.91 0.6,-0.91 ; 0.6,-0.41 0.6,-0.09 1,-0.09 1,-0.41 0.6,-0.41 ; 0.6,0.09 0.6,0.41 1,0.41 1,0.09 0.6,0.09 ; 0.6,0.59 0.6,0.91 1,0.91 1,0.59 0.6,0.59
  text "1" at -0.9,0.575 h0.5
  text "4" at -0.925,-0.9 h0.5
  text "5" at 0.7,-0.9 h0.5
  text "8" at 0.7,0.575 h0.5
  text "'.Designator'" at 0,0 h0.75
Mechanical 16:
  lines w0.01: 4.45,-3.25 4.45,-3.225 ; -1.3,-1.2 -1.3,1.2 1.3,1.2 1.3,-1.2 -1.3,-1.2
3D body "User Library-SON8-2x2mm-1.STEP": height 0.77, standoff -0.03, extent -1,-1 1,1
3D body: height 0.8, standoff 0, extent -1,-1 1,1
3D body: height 0.81, standoff 0.8, extent -0.873,0.526 -0.475,0.925

## L0603 [mm]
height 0.95
pads (2):
  rect 0.8x0.95 smd mask+0.05: 1(-0.8,0) 2(0.8,0)
Top Overlay:
  circle w0.12: c0,0 r0.103
  lines w0.12: -1.325,-0.6 1.325,-0.6 1.325,0.6 -1.325,0.6 -1.325,-0.6
Mechanical 14:
  lines w0.01: -0.875,-0.475 0.875,-0.475 0.875,0.475 -0.875,0.475 -0.875,-0.475
  text "'.Designator'" at 4.491,0.829 h0.75
Mechanical 16:
  lines w0.01: -1.4,-0.7 1.4,-0.7 1.4,0.7 -0.3,0.7 -1.4,0.7 -1.4,-0.7
3D body "L0603.STEP": height 0.5, standoff 0, extent -0.8,-0.4 0.8,0.4
3D body: height 0.95, standoff 0, extent -0.874,-0.474 0.874,0.474

## LED_0603_OSRAM_LG-Q396-PS-35_GREEN_1A2K_H0P4 [mm]
height 0.4
pads (2):
  rect 0.8x0.8 smd mask+0.05: 1(-0.75,0) 2(0.75,0)
Top Overlay:
  lines w0.12: -0.85,-0.525 0.85,-0.525 ; -0.85,0.525 0.85,0.525 ; 0.225,-0.525 0.225,0.525 ; 1.075,-0.525 1.275,-0.525 1.275,-0.25 ; 1.075,0.525 1.275,0.525 1.275,0.25
Mechanical 14:
  circle w0.01: c0.725,0.3 r0.1
  lines w0.01: -0.575,-0.45 -0.575,0.45 ; 0.575,-0.45 0.575,0.45 ; -0.85,-0.45 0.85,-0.45 0.85,0.45 -0.85,0.45 -0.85,-0.45 ; -0.125,0 0,0.125 0.125,0 0,-0.125 -0.125,0
  text "K" at 0.9,-0.25 h0.75
  text "'.Designator'" at -4.528,-0.808 h0.75
Mechanical 16:
  lines w0.01: -1.3,-0.65 1.35,-0.65 1.35,0.65 -0.475,0.65 -1.3,0.65 -1.3,-0.65
3D body: height 0.2, standoff 0, extent -0.2,-0.2 0.2,0.2
3D body: height 0.4, standoff 0, extent -0.575,-0.4 0.575,0.4
3D body: height 0.1, standoff 0, extent 0.575,-0.4 0.85,0.4
3D body: height 0.1, standoff 0, extent -0.85,-0.4 -0.575,0.4
3D body: height 0.1, standoff 0, extent -0.85,-0.45 0.85,-0.4
3D body: height 0.1, standoff 0, extent -0.85,0.4 0.85,0.45
3D body "LED_0603_GREEN.STEP": height 0.6, standoff 0, extent -0.8,-0.4 0.8,0.4

## LED_0603_OSRAM_LG-Q396-PS-35_GREEN_1A2K_H0P4_2 [mm]
pads (2):
  rect 0.8x0.8 smd mask+0.05: 1(-0.75,0) 2(0.75,0)
Top Overlay:
  lines w0.12: -0.85,-0.525 0.85,-0.525 ; -0.85,0.525 0.85,0.525 ; 0.225,-0.525 0.225,0.525 ; 1.075,-0.525 1.275,-0.525 1.275,-0.25 ; 1.075,0.525 1.275,0.525 1.275,0.25
Mechanical 14:
  circle w0.01: c0.725,0.3 r0.1
  lines w0.01: -0.575,-0.45 -0.575,0.45 ; 0.575,-0.45 0.575,0.45 ; -0.85,-0.45 0.85,-0.45 0.85,0.45 -0.85,0.45 -0.85,-0.45 ; -0.125,0 0,0.125 0.125,0 0,-0.125 -0.125,0
  text "K" at 0.9,-0.25 h0.75
  text "'.Designator'" at -4.554,0.091 h0.75
Mechanical 16:
  lines w0.01: -1.3,-0.65 1.35,-0.65 1.35,0.65 -0.475,0.65 -1.3,0.65 -1.3,-0.65
3D body: height 0.2, standoff 0, extent -0.2,-0.2 0.2,0.2
3D body: height 0.4, standoff 0, extent -0.575,-0.4 0.575,0.4
3D body: height 0.1, standoff 0, extent 0.575,-0.4 0.85,0.4
3D body: height 0.1, standoff 0, extent -0.85,-0.4 -0.575,0.4
3D body: height 0.1, standoff 0, extent -0.85,-0.45 0.85,-0.4
3D body: height 0.1, standoff 0, extent -0.85,0.4 0.85,0.45
3D body "LED_0603_GREEN.STEP": height 0.6, standoff 0, extent -0.8,-0.4 0.8,0.4

## LED_0603_OSRAM_LS-Q976-NR-1_RED_1A2K_H0P8 [mm]
height 0.8
pads (2):
  rect 0.8x0.8 smd mask+0.05: 1(-0.75,0) 2(0.75,0)
Top Overlay:
  lines w0.12: -0.85,-0.525 0.85,-0.525 ; -0.85,0.525 0.85,0.525 ; 0.225,-0.525 0.225,0.525 ; 1.075,-0.525 1.275,-0.525 1.275,-0.25 ; 1.075,0.525 1.275,0.525 1.275,0.25
Mechanical 14:
  circle w0.01: c0.725,0.3 r0.1
  lines w0.01: -0.575,-0.45 -0.575,0.45 ; 0.575,-0.45 0.575,0.45 ; -0.85,-0.45 0.85,-0.45 0.85,0.45 -0.85,0.45 -0.85,-0.45 ; -0.125,0 0,0.125 0.125,0 0,-0.125 -0.125,0
  text "K" at 0.9,-0.25 h0.75
  text "'.Designator'" at -4.528,-0.808 h0.75
Mechanical 16:
  lines w0.01: -1.3,-0.65 1.35,-0.65 1.35,0.65 -0.475,0.65 -1.3,0.65 -1.3,-0.65
3D body: height 0.31, standoff 0.3, extent 0.626,-0.1 0.825,0.1
3D body: height 0.8, standoff 0, extent -0.35,-0.3 0.35,0.3
3D body: height 0.8, standoff 0, extent -0.575,-0.4 0.575,0.4
3D body: height 0.3, standoff 0, extent 0.575,-0.4 0.85,0.4
3D body: height 0.3, standoff 0, extent -0.85,-0.4 -0.575,0.4
3D body: height 0.3, standoff 0, extent -0.85,-0.45 0.85,-0.4
3D body: height 0.3, standoff 0, extent -0.85,0.4 0.85,0.45